# Altium footprint library Connectors Molex.PcbLib: 105 footprints (part 1 of 7)
Each footprint in its own frame and in the unit in brackets; x right, y up, seen from the top. Pads: shape width x height; smd on the part's side, far side on the other; paste and mask are expansions set on the pad; w line width, h text height; cw(c..) or ccw(c..) is an arc to the next point about the centre after c.
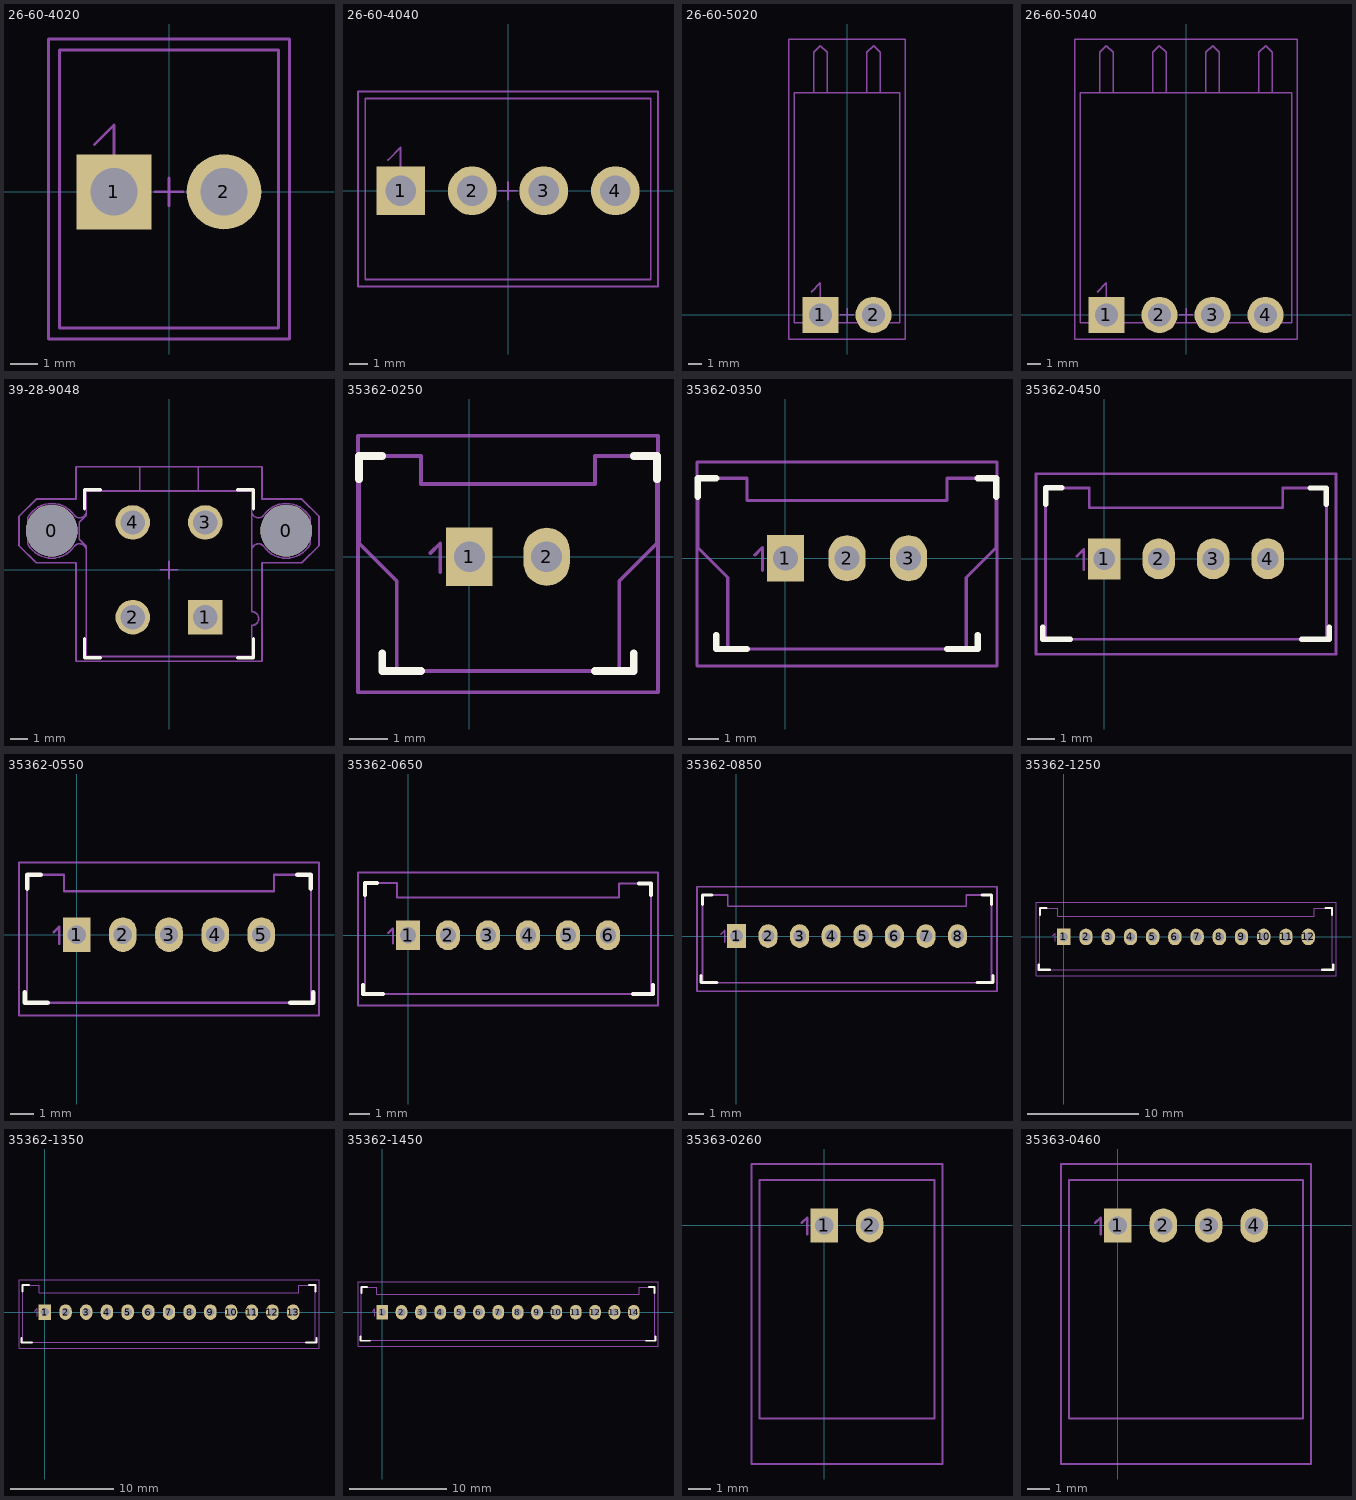
[diagram p0: the footprints below, top view; thin cyan lines are the x and y axes]

## 26-60-4020 [mm] "KK® 41791"
height 14.8
pads (2):
  rect 2.7x2.7 hole 1.7: 1(-1.98,0)
  round 2.7 hole 1.7: 2(1.98,0)
Mechanical 13:
  lines w0.1: -2.68,1.7 -1.98,2.4 -1.98,0 ; -3.94,-4.9 3.94,-4.9 3.94,5.1 -3.94,5.1 -3.94,-4.9
  text ".Designator" at -0.8,-0.6 h1.5
Mechanical 15:
  lines w0.1: -0.5,0 0.5,0 ; 0,-0.5 0,0.5 ; -4.34,-5.3 -4.34,5.5 4.34,5.5 4.34,-5.3 -4.34,-5.3
3D body "026604020.stp": height 14.73, standoff -3.56, extent -3.9,-4.9 3.872,5.108

## 26-60-4040 [mm] "KK® 41791"
height 14.8
pads (4):
  rect 2.7x2.7 hole 1.7: 1(-5.94,0)
  round 2.7 hole 1.7: 2(-1.98,0) 3(1.98,0) 4(5.94,0)
Mechanical 13:
  lines w0.1: -6.64,1.7 -5.94,2.4 -5.94,0 ; -7.9,-4.9 -7.9,5.1 7.9,5.1 7.9,-4.9 -7.9,-4.9
  text ".Designator" at -0.8,-0.6 h1.5
Mechanical 15:
  lines w0.1: -0.5,0 0.5,0 ; 0,-0.5 0,0.5 ; -8.3,-5.3 8.3,-5.3 8.3,5.5 -8.3,5.5 -8.3,-5.3
3D body "026604040.stp": height 14.73, standoff -3.56, extent -7.849,-4.864 7.849,5.143

## 26-60-5020 [mm] "KK® 41792"
height 10
pads (2):
  rect 2.7x2.7 hole 1.7: 1(-1.98,0)
  round 2.7 hole 1.7: 2(1.98,0)
Mechanical 13:
  lines w0.1: -2.68,1.7 -1.98,2.4 -1.98,0 ; -2.48,16.6 -2.48,19.6 -1.98,20.1 ; -1.48,16.6 -1.48,19.6 -1.98,20.1 ; 1.48,16.6 1.48,19.6 1.98,20.1 ; 2.48,16.6 2.48,19.6 1.98,20.1 ; -1.98,20.1 -1.98,20.1 ; 1.98,20.1 1.98,20.1 ; -3.94,-0.6 -3.94,16.6 3.94,16.6 3.94,-0.6 -3.94,-0.6
  text ".Designator" at -1.1,2.5 h1.5
Mechanical 15:
  lines w0.1: -0.5,0 0.5,0 ; 0,-0.5 0,0.5 ; -4.34,-1.8 4.34,-1.8 4.34,20.6 -4.34,20.6 -4.34,-1.8
3D body "026605020.stp": height 10.01, standoff -3.96, extent -3.886,-0.6 3.886,20.114

## 26-60-5040 [mm] "KK® 41792"
height 10
pads (4):
  rect 2.7x2.7 hole 1.7: 1(-5.94,0)
  round 2.7 hole 1.7: 2(-1.98,0) 3(1.98,0) 4(5.94,0)
Mechanical 13:
  lines w0.1: -6.64,1.7 -5.94,2.4 -5.94,0 ; -6.44,16.6 -6.44,19.6 -5.94,20.1 ; -5.44,16.6 -5.44,19.6 -5.94,20.1 ; -2.48,16.6 -2.48,19.6 -1.98,20.1 ; -1.48,16.6 -1.48,19.6 -1.98,20.1 ; 1.48,16.6 1.48,19.6 1.98,20.1 ; 2.48,16.6 2.48,19.6 1.98,20.1 ; 5.44,16.6 5.44,19.6 5.94,20.1 ; 6.44,16.6 6.44,19.6 5.94,20.1 ; -5.94,20.1 -5.94,20.1 ; -1.98,20.1 -1.98,20.1 ; 1.98,20.1 1.98,20.1 ; 5.94,20.1 5.94,20.1 ; -7.9,-0.6 -7.9,16.6 7.9,16.6 7.9,-0.6 -7.9,-0.6
  text ".Designator" at -1.1,2.5 h1.5
Mechanical 15:
  lines w0.1: -0.5,0 0.5,0 ; 0,-0.5 0,0.5 ; -8.3,-1.8 8.3,-1.8 8.3,20.6 -8.3,20.6 -8.3,-1.8
3D body "026605040.stp": height 10.01, standoff -3.96, extent -7.849,-0.6 7.849,20.114

## 39-28-9048 [mm] "Mini-Fit® Jr™ 5566  For 1.78mm max thick PCB"
height 12.8
pads (6):
  round 3 hole 3 unplated: 0(-6.8,2.27) 0(6.8,2.27)
  rect 2x2 hole 1.4: 1(2.1,-2.75)
  round 2 hole 1.4: 2(-2.1,-2.75) 3(2.1,2.75) 4(-2.1,2.75)
Top Overlay:
  lines w0.2: -4.9,-4 -4.9,-5.1 -4,-5.1 ; -4.9,3.54 -4.9,4.64 -4,4.64 ; 4,-5.1 4.9,-5.1 4.9,-4 ; 4,4.64 4.9,4.64 4.9,3.54
Mechanical 13:
  lines w0.1: -4.8,1.125 ccw(c-5.185,1.125) -5.5,1.346 cw(c-6.8,2.26) -8.189,1.488 -8.189,3.032 cw(c-6.8,2.26) -5.5,3.174 ccw(c-5.185,3.395) -4.8,3.395 ; 4.8,1.125 cw(c5.185,1.125) 5.5,1.346 ccw(c6.8,2.26) 8.189,1.488 8.189,3.032 ccw(c6.8,2.26) 5.5,3.174 cw(c5.185,3.395) 4.8,3.395 ; -1.7,4.57 1.7,4.57 ; -1.7,4.57 -4.8,4.57 -4.8,3.16 -5.2,2.76 -5.2,1.76 -4.8,1.36 -4.8,-5.03 4.8,-5.03 4.8,-3.23 ccw(c4.8,-2.83) 4.8,-2.43 4.8,4.57 1.7,4.57 ; -1.7,4.57 -1.7,5.97 1.7,5.97 1.7,4.57
  text "2" at -3.2,-3.1 h1
  text "1" at 2.7,-3.1 h1
  text ".Designator" at -0.7,0 h1.5
Mechanical 15:
  lines w0.1: -0.5,0 0.5,0 ; 0,-0.5 0,0.5 ; -8.7,1.4 -7.7,0.4 -5.4,0.4 -5.4,-5.3 5.4,-5.3 5.4,0.4 7.7,0.4 8.7,1.4 8.7,3.1 7.7,4.1 5.4,4.1 5.4,5.97 -5.4,5.97 -5.4,4.1 -7.7,4.1 -8.7,3.1 -8.7,1.4
3D body "039289048.stp": height 12.8, standoff -3.5, extent -8.189,-5.03 8.189,5.97

## 35362-0250 [mm] "Sherlock™ 35362"
height 8.5
pads (2):
  rect 1.2x1.5 hole 0.8: 1(0,0)
  oval 1.2x1.5 hole 0.8: 2(2,0)
Top Overlay:
  lines w0.2: -2.85,2 -2.85,2.6 -2.25,2.6 ; -2.25,-2.5 -2.25,-2.95 -1.25,-2.95 ; 3.25,-2.95 4.25,-2.95 4.25,-2.5 ; 4.25,2.6 4.85,2.6 4.85,2
Mechanical 13:
  lines w0.1: -1,0.1 -0.75,0.35 -0.75,-0.4 ; -2.85,0.375 -2.85,0.35 -1.875,-0.625 -1.875,-2.95 3.875,-2.95 3.875,-0.625 4.85,0.35 4.85,0.375 ; -2.85,0.375 -2.85,0.375 ; -2.85,0.375 -2.85,2.6 -1.25,2.6 -1.25,1.875 3.25,1.875 3.25,2.6 4.85,2.6 4.85,0.375 ; 4.85,0.375 4.85,0.375
  text ".Designator" at -0.675,-2.2 h1.5
Mechanical 15:
  lines w0.1: -2.875,-3.5 4.875,-3.5 4.875,3.125 -2.875,3.125 -2.875,-3.5
3D body "353620250.stp": height 8.5, standoff -3.3, extent -2.85,-2.95 4.85,2.6

## 35362-0350 [mm] "Sherlock™ 35362"
height 8.5
pads (3):
  rect 1.2x1.5 hole 0.8: 1(0,0)
  oval 1.2x1.5 hole 0.8: 2(2,0) 3(4,0)
Top Overlay:
  lines w0.2: -2.85,2 -2.85,2.6 -2.25,2.6 ; -2.25,-2.5 -2.25,-2.95 -1.25,-2.95 ; 5.25,-2.95 6.25,-2.95 6.25,-2.5 ; 6.25,2.6 6.85,2.6 6.85,2
Mechanical 13:
  lines w0.1: -1,0.1 -0.75,0.35 -0.75,-0.4 ; -2.85,0.375 -2.85,2.6 -1.25,2.6 -1.25,1.875 5.25,1.875 5.25,2.6 6.85,2.6 6.85,0.375 ; -2.85,0.375 -2.85,0.375 ; -2.85,0.375 -2.85,0.35 -1.875,-0.625 -1.875,-2.95 5.875,-2.95 5.875,-0.625 6.85,0.35 6.85,0.375 ; 6.85,0.375 6.85,0.375
  text ".Designator" at 0.7,-2.3 h1.5
Mechanical 15:
  lines w0.1: -2.875,-3.5 -2.875,3.125 6.875,3.125 6.875,-3.5 -2.875,-3.5
3D body "353620350.stp": height 8.5, standoff -3.3, extent -2.85,-2.95 6.85,2.6

## 35362-0450 [mm] "Sherlock™ 35362"
height 8.5
pads (4):
  rect 1.2x1.5 hole 0.8: 1(0,0)
  oval 1.2x1.5 hole 0.8: 2(2,0) 3(4,0) 4(6,0)
Top Overlay:
  lines w0.2: -2.25,-2.5 -2.25,-2.95 -1.25,-2.95 ; -2.15,2 -2.15,2.6 -1.55,2.6 ; 7.25,-2.95 8.25,-2.95 8.25,-2.5 ; 7.55,2.6 8.15,2.6 8.15,2
Mechanical 13:
  lines w0.1: -1,0.1 -0.75,0.35 -0.75,-0.4 ; -2.15,-2.95 -2.15,2.6 -0.55,2.6 -0.55,1.875 6.55,1.875 6.55,2.6 8.15,2.6 8.15,-2.95 -2.15,-2.95
  text ".Designator" at 1.8,-2.3 h1.5
Mechanical 15:
  lines w0.1: -2.5,-3.5 8.5,-3.5 8.5,3.125 -2.5,3.125 -2.5,-3.5
3D body "353620450.stp": height 8.5, standoff -3.3, extent -2.15,-2.95 8.15,2.6

## 35362-0550 [mm] "Sherlock™ 35362"
height 8.5
pads (5):
  rect 1.2x1.5 hole 0.8: 1(0,0)
  oval 1.2x1.5 hole 0.8: 2(2,0) 3(4,0) 4(6,0) 5(8,0)
Top Overlay:
  lines w0.2: -2.25,-2.5 -2.25,-2.95 -1.25,-2.95 ; -2.15,2 -2.15,2.6 -1.55,2.6 ; 9.25,-2.95 10.25,-2.95 10.25,-2.5 ; 9.55,2.6 10.15,2.6 10.15,2
Mechanical 13:
  lines w0.1: -1,0.1 -0.75,0.35 -0.75,-0.4 ; -2.15,-2.95 10.15,-2.95 10.15,2.6 8.55,2.6 8.55,1.875 -0.55,1.875 -0.55,2.6 -2.15,2.6 -2.15,-2.95
  text ".Designator" at 2.4,-2.2 h1.5
Mechanical 15:
  lines w0.1: -2.5,-3.5 -2.5,3.125 10.5,3.125 10.5,-3.5 -2.5,-3.5
3D body "353620550.stp": height 8.5, standoff -3.3, extent -2.15,-2.95 10.15,2.6

## 35362-0650 [mm] "Sherlock™ 35362"
height 8.5
pads (6):
  rect 1.2x1.5 hole 0.8: 1(0,0)
  oval 1.2x1.5 hole 0.8: 2(2,0) 3(4,0) 4(6,0) 5(8,0) 6(10,0)
Top Overlay:
  lines w0.2: -2.25,-2.5 -2.25,-2.95 -1.25,-2.95 ; -2.15,2 -2.15,2.6 -1.55,2.6 ; 11.25,-2.95 12.25,-2.95 12.25,-2.5 ; 11.55,2.6 12.15,2.6 12.15,2
Mechanical 13:
  lines w0.1: -1,0.1 -0.75,0.35 -0.75,-0.4 ; -2.15,-2.95 -2.15,2.6 -0.55,2.6 -0.55,1.875 10.55,1.875 10.55,2.6 12.15,2.6 12.15,-2.95 -2.15,-2.95
  text ".Designator" at 4.2,-2.3 h1.5
Mechanical 15:
  lines w0.1: -2.5,-3.5 12.5,-3.5 12.5,3.125 -2.5,3.125 -2.5,-3.5
3D body "353620650.stp": height 8.5, standoff -3.3, extent -2.15,-2.95 12.15,2.6

## 35362-0850 [mm] "Sherlock™ 35362"
height 8.5
pads (8):
  rect 1.2x1.5 hole 0.8: 1(0,0)
  oval 1.2x1.5 hole 0.8: 2(2,0) 3(4,0) 4(6,0) 5(8,0) 6(10,0) 7(12,0) 8(14,0)
Top Overlay:
  lines w0.2: -2.25,-2.5 -2.25,-2.95 -1.25,-2.95 ; -2.15,2 -2.15,2.6 -1.55,2.6 ; 15.25,-2.95 16.25,-2.95 16.25,-2.5 ; 15.55,2.6 16.15,2.6 16.15,2
Mechanical 13:
  lines w0.1: -1,0.1 -0.75,0.35 -0.75,-0.4 ; -2.15,-2.95 -2.15,2.6 -0.55,2.6 -0.55,1.875 14.55,1.875 14.55,2.6 16.15,2.6 16.15,-2.95 -2.15,-2.95
  text ".Designator" at 6,-2.3 h1.5
Mechanical 15:
  lines w0.1: -2.5,-3.5 16.5,-3.5 16.5,3.125 -2.5,3.125 -2.5,-3.5
3D body "353620850.stp": height 8.5, standoff -3.3, extent -2.15,-2.95 16.15,2.6

## 35362-1250 [mm] "Sherlock™ 35362"
height 8.5
pads (12):
  rect 1.2x1.5 hole 0.8: 1(0,0)
  oval 1.2x1.5 hole 0.8: 2(2,0) 3(4,0) 4(6,0) 5(8,0) 6(10,0) 7(12,0) 8(14,0) 9(16,0) 10(18,0) 11(20,0) 12(22,0)
Top Overlay:
  lines w0.2: -2.25,-2.5 -2.25,-2.95 -1.25,-2.95 ; -2.15,2 -2.15,2.6 -1.55,2.6 ; 23.25,-2.95 24.25,-2.95 24.25,-2.5 ; 23.55,2.6 24.15,2.6 24.15,2
Mechanical 13:
  lines w0.1: -1,0.1 -0.75,0.35 -0.75,-0.4 ; -2.15,-2.95 24.15,-2.95 24.15,2.6 22.55,2.6 22.55,1.875 -0.55,1.875 -0.55,2.6 -2.15,2.6 -2.15,-2.95
  text ".Designator" at 8.8,-2.4 h1.5
Mechanical 15:
  lines w0.1: -2.5,-3.5 -2.5,3.125 24.5,3.125 24.5,-3.5 -2.5,-3.5
3D body "353621250.stp": height 8.5, standoff -3.3, extent -2.15,-2.95 24.15,2.6

## 35362-1350 [mm] "Sherlock™ 35362"
height 8.5
pads (13):
  rect 1.2x1.5 hole 0.8: 1(0,0)
  oval 1.2x1.5 hole 0.8: 2(2,0) 3(4,0) 4(6,0) 5(8,0) 6(10,0) 7(12,0) 8(14,0) 9(16,0) 10(18,0) 11(20,0) 12(22,0) 13(24,0)
Top Overlay:
  lines w0.2: -2.25,-2.5 -2.25,-2.95 -1.25,-2.95 ; -2.15,2 -2.15,2.6 -1.55,2.6 ; 25.25,-2.95 26.25,-2.95 26.25,-2.5 ; 25.55,2.6 26.15,2.6 26.15,2
Mechanical 13:
  lines w0.1: -1,0.1 -0.75,0.35 -0.75,-0.4 ; 26.15,-2.95 26.15,2.6 24.55,2.6 24.55,1.875 -0.55,1.875 -0.55,2.6 -2.15,2.6 -2.15,-2.9 26.15,-2.9
  text ".Designator" at 8.8,-2.4 h1.5
Mechanical 15:
  lines w0.1: -2.5,-3.5 -2.5,3.125 26.5,3.125 26.5,-3.5 -2.5,-3.5
3D body "353621350.stp": height 8.5, standoff -3.3, extent -2.15,-2.95 26.15,2.6

## 35362-1450 [mm] "Sherlock™ 35362"
height 8.5
pads (14):
  rect 1.2x1.5 hole 0.8: 1(0,0)
  oval 1.2x1.5 hole 0.8: 2(2,0) 3(4,0) 4(6,0) 5(8,0) 6(10,0) 7(12,0) 8(14,0) 9(16,0) 10(18,0) 11(20,0) 12(22,0) 13(24,0) 14(26,0)
Top Overlay:
  lines w0.2: -2.25,-2.5 -2.25,-2.95 -1.25,-2.95 ; -2.15,2 -2.15,2.6 -1.55,2.6 ; 27.25,-2.95 28.25,-2.95 28.25,-2.5 ; 27.55,2.6 28.15,2.6 28.15,2
Mechanical 13:
  lines w0.1: -1,0.1 -0.75,0.35 -0.75,-0.4 ; 28.15,-2.95 28.15,2.6 26.55,2.6 26.55,1.875 -0.55,1.875 -0.55,2.6 -2.15,2.6 -2.15,-2.9 28.15,-2.9
  text ".Designator" at 11.5,-2.2 h1.5
Mechanical 15:
  lines w0.1: -2.5,-3.5 28.5,-3.5 28.5,3.125 -2.5,3.125 -2.5,-3.5
3D body "353621450.stp": height 8.5, standoff -3.3, extent -2.15,-2.95 28.15,2.6

## 35363-0260 [mm] "Sherlock™ 35363"
height 5.5
pads (2):
  rect 1.2x1.5 hole 0.8: 1(0,0)
  oval 1.2x1.5 hole 0.8: 2(2,0)
Mechanical 13:
  lines w0.1: -1,0.1 -0.75,0.35 -0.75,-0.4 ; -2.85,-8.5 -2.85,2 4.85,2 4.85,-8.5 -2.85,-8.5
  text ".Designator" at 0.1,-2.5 h1.5
Mechanical 15:
  lines w0.1: -3.2,-10.5 5.2,-10.5 5.2,2.7 -3.2,2.7 -3.2,-10.5
3D body "353630260.stp": height 5.5, standoff -3.2, extent -2.85,-8.5 4.85,2

## 35363-0460 [mm] "Sherlock™ 35363"
height 5.5
pads (4):
  rect 1.2x1.5 hole 0.8: 1(0,0)
  oval 1.2x1.5 hole 0.8: 2(2,0) 3(4,0) 4(6,0)
Mechanical 13:
  lines w0.1: -1,0.1 -0.75,0.35 -0.75,-0.4 ; -2.15,-8.5 -2.15,2 8.15,2 8.15,-8.5 -2.15,-8.5
  text ".Designator" at 1.9,-3 h1.5
Mechanical 15:
  lines w0.1: -2.5,-10.5 8.5,-10.5 8.5,2.7 -2.5,2.7 -2.5,-10.5
3D body "353630460.stp": height 5.5, standoff -3.2, extent -2.15,-8.5 8.15,2